# Altium footprint library USB Connectors.PcbLib: 41 footprints (part 1 of 3)
Each footprint in its own frame and in the unit in brackets; x right, y up, seen from the top. Pads: shape width x height; smd on the part's side, far side on the other; paste and mask are expansions set on the pad; w line width, h text height; cw(c..) or ccw(c..) is an arc to the next point about the centre after c.
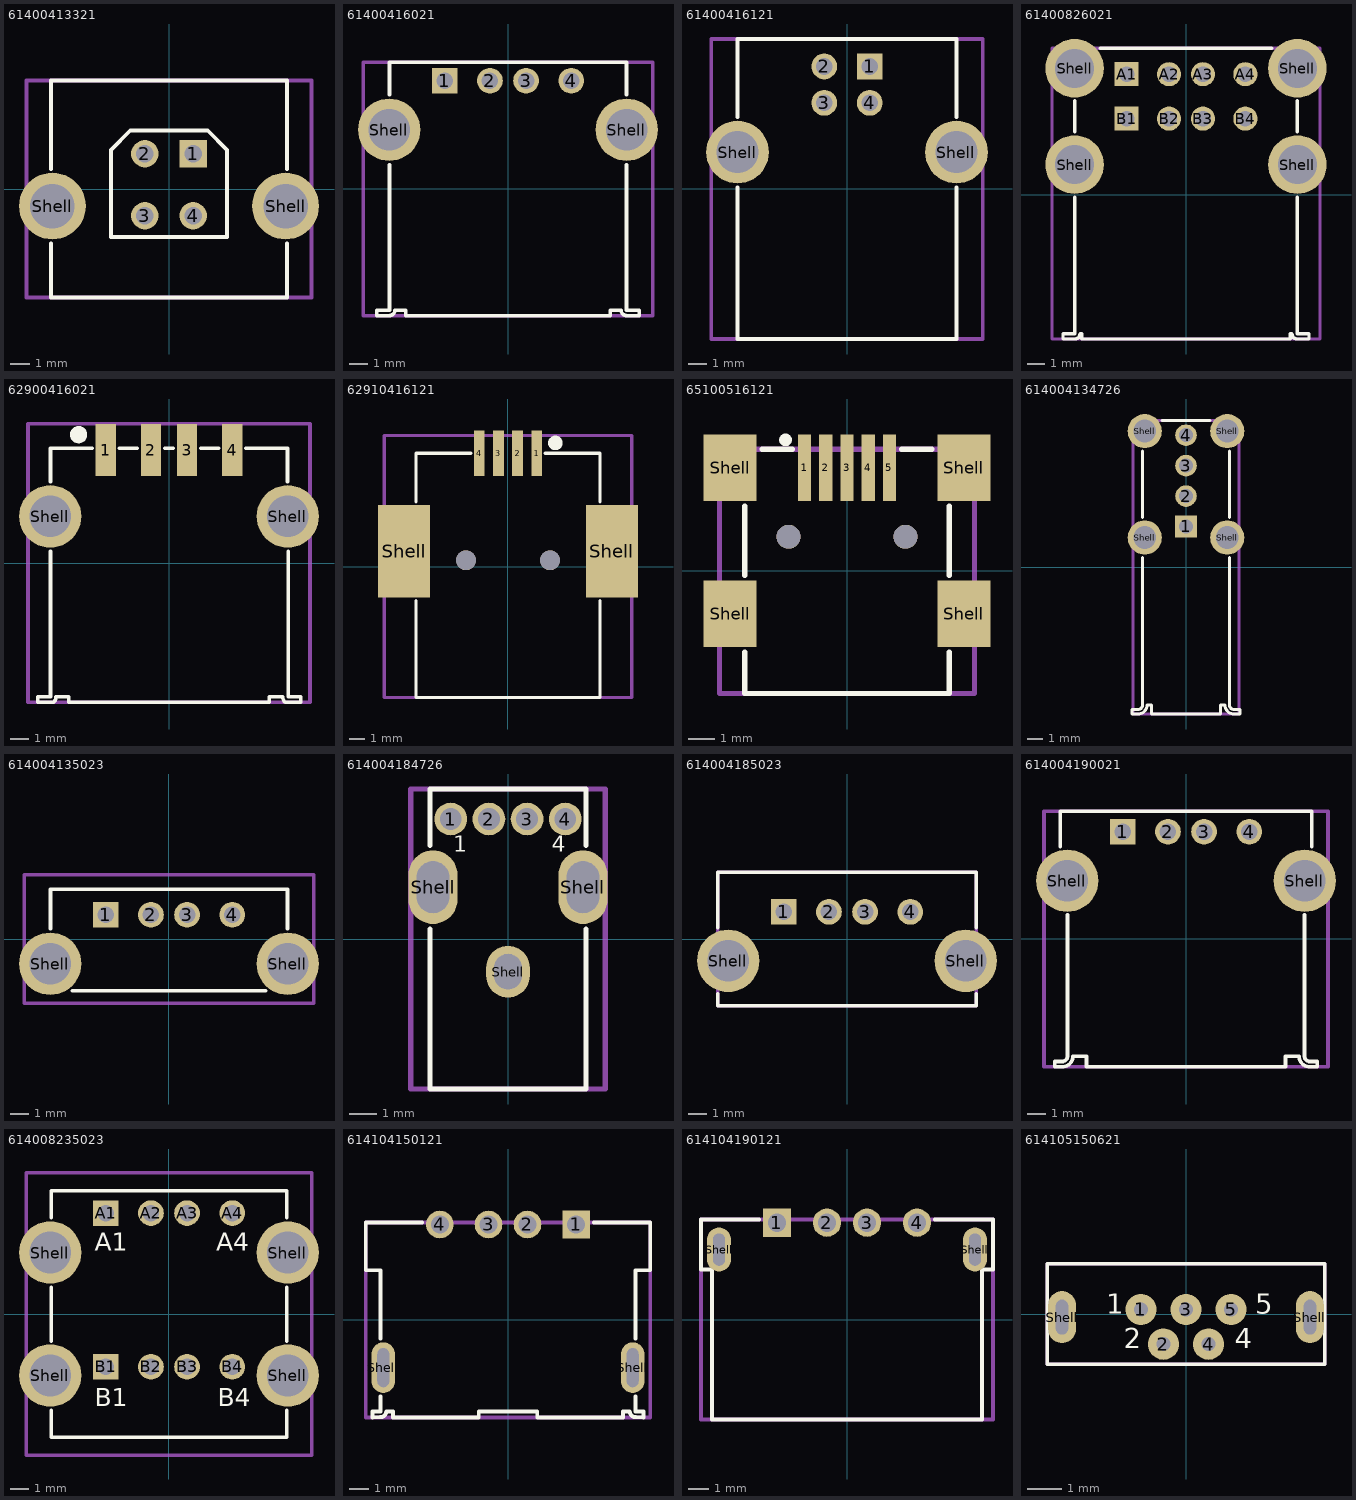
[diagram p0: the footprints below, top view; thin cyan lines are the x and y axes]

## 61400413321 [mm] "USB 2.0 Type B Vertical"
height 16.1
pads (6):
  rect 1.42x1.42 hole 0.92: 1(1.25,1.82)
  round 1.42 hole 0.92: 2(-1.25,1.82) 3(-1.25,-1.38) 4(1.25,-1.38)
  round 3.45 hole 2.3: Shell(-6.02,-0.88) Shell(6.02,-0.88)
Top Overlay:
  lines w0.2: -6.1,-2.8 -6.1,-5.6 6.1,-5.6 6.1,-2.8 ; -6.1,1.04 -6.1,5.6 6.1,5.6 6.1,1.04 ; -3,-2.48 3,-2.48 3,2.02 2,3.02 -2,3.02 -3,2.02 -3,-2.48
Mechanical 13:
  lines w0.2: -7.35,-5.6 -7.35,5.6 7.35,5.6 7.35,-5.6 -7.35,-5.6
3D body "61400413321.stp": height 16.15, standoff -4.17, extent -7.35,-5.6 7.35,5.6

## 61400416021 [mm] "USB 2.0 Type A Horizontal"
height 6.9
pads (6):
  rect 1.42x1.42 hole 0.92: 1(-3.5,5.99)
  round 1.42 hole 0.92: 2(-1,5.99) 3(1,5.99) 4(3.5,5.99)
  round 3.45 hole 2.3: Shell(-6.57,3.28) Shell(6.57,3.28)
Top Overlay:
  lines w0.2: -6.55,1.35 -6.55,-6.7 -7.25,-6.7 -7.25,-7 -6.56,-7 ccw(c-6.55,-6.7) -6.25,-6.7 -5.65,-6.7 -5.65,-7 5.65,-7 5.65,-6.7 6.25,-6.7 ccw(c6.55,-6.7) 6.56,-7 7.25,-7 7.25,-6.7 6.55,-6.7 6.55,1.35 ; -6.55,5.21 -6.55,7 6.55,7 6.55,5.21
Mechanical 13:
  lines w0.2: -8,-7 8,-7 8,7 -8,7 -8,-7
3D body "61400416021.stp": height 7.63, standoff -4.06, extent -7.999,-7 7.999,7

## 61400416121 [mm] "USB 2.0 Type B Horizontal"
height 11.05
pads (6):
  rect 1.42x1.42 hole 0.92: 1(1.25,6.74)
  round 1.42 hole 0.92: 2(-1.25,6.74) 3(-1.25,4.74) 4(1.25,4.74)
  round 3.45 hole 2.3: Shell(-6.02,2.03) Shell(6.02,2.03)
Top Overlay:
  lines w0.2: -6.02,0.1 -6.02,-8.25 6.02,-8.25 6.02,0.1 ; -6.02,3.96 -6.02,8.25 6.02,8.25 6.02,3.96
Mechanical 13:
  lines w0.2: -7.47,-8.25 7.47,-8.25 7.47,8.25 -7.47,8.25 -7.47,-8.25
3D body "61400416121.stp": height 11.1, standoff -3.76, extent -7.484,-8.25 7.484,8.25

## 61400826021 [mm] "USB 2.0 Type A Horizontal Dual Stacked"
height 15.34
pads (12):
  rect 1.42x1.42 hole 0.92: A1(-3.5,7.11) B1(-3.5,4.49)
  round 1.42 hole 0.92: A2(-1,7.11) A3(1,7.11) A4(3.5,7.11) B2(-1,4.49) B3(1,4.49) B4(3.5,4.49)
  round 3.45 hole 2.3: Shell(-6.57,1.78) Shell(-6.57,7.46) Shell(6.57,1.78) Shell(6.57,7.46)
Top Overlay:
  lines w0.2: -6.55,-0.14 -6.55,-8.2 -7.25,-8.2 -7.25,-8.5 -6.56,-8.5 ccw(c-6.55,-8.2) -6.25,-8.2 -6.15,-8.2 -6.15,-8.5 6.15,-8.5 6.15,-8.2 6.25,-8.2 ccw(c6.55,-8.2) 6.56,-8.5 7.25,-8.5 7.25,-8.2 6.55,-8.2 6.55,-0.14 ; -6.55,3.71 -6.55,5.54 ; -5.06,8.65 5.06,8.65 ; 6.55,3.71 6.55,5.54
Mechanical 13:
  lines w0.2: -7.9,-8.5 -7.9,8.65 7.9,8.65 7.9,-8.5 -7.9,-8.5
3D body "61400826021.stp": height 15.93, standoff -3.91, extent -7.912,-8.5 7.912,8.65

## 62900416021 [mm] "USB 2.0 SMT Type A Horizontal"
height 7.12
pads (6):
  rect 1.12x2.88 smd: 1(-3.5,6.25) 2(-1,6.25) 3(1,6.25) 4(3.5,6.25)
  round 3.45 hole 2.3: Shell(-6.57,2.58) Shell(6.57,2.58)
Top Overlay:
  circle w0.5: c-5,7.1 r0.224
  lines w0.2: -6.55,0.66 -6.55,-7.4 -7.25,-7.4 -7.25,-7.7 -6.39,-7.7 ; -6.55,4.5 -6.55,6.35 -4.26,6.35 ; -6.388,-7.702 ccw(c-6.65,-7.4) -6.25,-7.4 -5.55,-7.4 -5.55,-7.7 5.55,-7.7 5.55,-7.4 6.29,-7.4 ccw(c6.69,-7.4) 6.428,-7.702 ; -2.75,6.35 -1.76,6.35 ; -0.24,6.35 0.24,6.35 ; 1.75,6.35 2.74,6.35 ; 4.26,6.35 6.55,6.35 6.55,4.5 ; 6.43,-7.7 7.29,-7.7 7.29,-7.4 6.59,-7.4 6.59,0.66
Mechanical 13:
  lines w0.2: -7.8,-7.7 7.8,-7.7 7.8,7.7 -7.8,7.7 -7.8,-7.7
3D body "62900416021.stp": height 7.81, standoff -3.89, extent -7.81,-7.7 7.81,7.705

## 62910416121 [mm] "USB 2.0 Type B SMT Horizontal"
height 11.5
pads (8):
  rect 0.7x3 smd: 1(1.875,7.425) 2(0.625,7.425) 3(-0.625,7.425) 4(-1.875,7.425)
  rect 3.4x6.04 smd: Shell(-6.8,1.005) Shell(6.8,1.005)
  round 1.3 hole 1.3 unplated: ""(-2.75,0.425) ""(2.75,0.425)
Top Overlay:
  circle w0.5: c3.1,8.1 r0.224
  lines w0.2: -6.02,-2.215 -6.02,-8.575 6.02,-8.575 6.02,-2.215 ; -6.02,4.225 -6.02,7.425 -2.43,7.425 ; 2.43,7.425 6.02,7.425 6.02,4.225
Mechanical 13:
  lines w0.2: -8.1,-8.575 8.1,-8.575 8.1,8.575 -8.1,8.575 -8.1,-8.575
3D body "62910416121.stp": height 10.8, standoff -1.48, extent -8,-8.575 8,8.575

## 65100516121 [mm] "Mini USB 2.0 Type B SMT Horizontal 5 Contacts"
height 3.9
pads (11):
  rect 0.5x2.5 smd: 1(-1.6,3.875) 2(-0.8,3.875) 3(0,3.875) 4(0.8,3.875) 5(1.6,3.875)
  rect 2x2.5 smd: Shell(-4.4,-1.625) Shell(-4.4,3.875) Shell(4.4,-1.625) Shell(4.4,3.875)
  round 0.9 hole 0.9 unplated: ""(-2.2,1.275) ""(2.2,1.275)
Top Overlay:
  circle w0.25: c-2.314,4.925 r0.114
  lines w0.2: -3.85,-3.075 -3.85,-4.625 3.85,-4.625 3.85,-3.075 ; -3.85,-0.175 -3.85,2.425 ; -3.2,4.575 -2.05,4.575 ; 2.05,4.575 3.2,4.575 ; 3.85,-0.175 3.85,2.425
Mechanical 13:
  lines w0.2: -4.8,-4.625 4.8,-4.625 4.8,4.575 -4.8,4.575 -4.8,-4.625
3D body "65100516121.stp": height 3.92, standoff -0.98, extent -4.8,-4.625 4.8,4.625

## 614004134726 [mm] "USB 2.0 Type A Up Right"
height 14.5
pads (8):
  rect 1.42x1.42 hole 0.92: 1(0,2.68)
  round 1.42 hole 0.92: 2(0,4.68) 3(0,6.68) 4(0,8.68)
  round 2.25 hole 1.5: Shell(-2.71,1.95) Shell(-2.71,8.95) Shell(2.71,1.95) Shell(2.71,8.95)
Top Overlay:
  lines w0.2: -2.86,0.63 -2.86,-9.06 cw(c-3.15,-9.06) -3.15,-9.35 -3.55,-9.35 -3.55,-9.65 -3.15,-9.65 ccw(c-3.15,-9.06) -2.56,-9.06 -2.27,-9.06 -2.27,-9.65 2.27,-9.65 2.27,-9.06 2.56,-9.06 ccw(c3.15,-9.06) 3.15,-9.65 3.55,-9.65 3.55,-9.35 3.15,-9.35 cw(c3.15,-9.06) 2.86,-9.06 2.86,0.63 ; -2.86,3.27 -2.86,7.64 ; -1.59,9.65 1.59,9.65 ; 2.86,3.27 2.86,7.64
Mechanical 13:
  lines w0.2: -3.475,-9.65 -3.475,9.65 3.475,9.65 3.475,-9.65 -3.475,-9.65
3D body "614004134726.stp": height 14.51, standoff -3.8, extent -3.55,-9.65 3.55,9.65

## 614004135023 [mm] "USB 2.0 Type A Vertical"
height 15
pads (6):
  rect 1.42x1.42 hole 0.92: 1(-3.5,1.34)
  round 1.42 hole 0.92: 2(-1,1.34) 3(1,1.34) 4(3.5,1.34)
  round 3.45 hole 2.3: Shell(-6.57,-1.37) Shell(6.57,-1.37)
Top Overlay:
  lines w0.2: -6.55,0.56 -6.55,2.76 6.55,2.76 6.55,0.56 ; -5.35,-2.86 5.34,-2.86
Mechanical 13:
  lines w0.2: -8,-3.56 -8,3.56 8,3.56 8,-3.56 -8,-3.56
3D body "614004135023.stp": height 15.02, standoff -4.28, extent -7.999,-3.56 7.999,3.56

## 614004184726 [mm] "USB 2.0 Type A Up Right THT"
height 14.2
pads (7):
  round 1.2 hole 0.8: 1(-2.1,4.4) 2(-0.7,4.4) 3(0.7,4.4) 4(2.1,4.4)
  oval 1.8x2.7 hole 1.2 slot 1.9 at 90 deg: Shell(-2.75,1.9) Shell(2.75,1.9)
  oval 1.6x1.9 hole 1 slot 1.3 at 90 deg: Shell(0,-1.2)
Top Overlay:
  lines w0.2: -2.86,0.36 -2.86,-5.5 2.86,-5.5 2.86,0.36 ; -2.86,3.44 -2.86,5.5 2.86,5.5 2.86,3.44
  text "1" at -2,3 h1.02
  text "4" at 1.6,3.003 h1.02
Mechanical 13:
  lines w0.2: -3.56,-5.5 -3.56,5.5 3.56,5.5 3.56,-5.5 -3.56,-5.5
3D body "614004184726.stp": height 14.3, standoff -2.74, extent -3.56,-5.5 3.56,5.5

## 614004185023 [mm] "USB 2.0 Type A Vertical Short Type THT"
height 10
pads (6):
  rect 1.42x1.42 hole 0.92: 1(-3.5,1.5)
  round 1.42 hole 0.92: 2(-1,1.5) 3(1,1.5) 4(3.5,1.5)
  round 3.45 hole 2.3: Shell(-6.57,-1.21) Shell(6.57,-1.21)
Top Overlay:
  lines w0.2: -7.15,-3.04 -7.15,-3.7 7.15,-3.7 7.15,-3.04 ; -7.15,0.62 -7.15,3.7 7.15,3.7 7.15,0.62
Mechanical 13:
  lines w0.2: -7.15,-3.7 -7.15,3.7 7.15,3.7 7.15,-3.7 -7.15,-3.7
3D body "614004185023.stp": height 10.05, standoff -2.95, extent -7.15,-3.7 7.15,3.7

## 614004190021 [mm] "USB 2.0 Type A Horizontal THT"
height 6.9
pads (6):
  rect 1.42x1.42 hole 0.92: 1(-3.5,5.935)
  round 1.42 hole 0.92: 2(-1,5.935) 3(1,5.935) 4(3.5,5.935)
  round 3.45 hole 2.3: Shell(-6.57,3.225) Shell(6.57,3.225)
Top Overlay:
  lines w0.2: -6.95,5.115 -6.95,7.075 6.95,7.075 6.95,5.115 ; -6.55,1.335 -6.55,-6.475 cw(c-6.85,-6.475) -6.85,-6.775 -7.25,-6.775 -7.25,-7.075 -6.85,-7.075 ccw(c-6.85,-6.475) -6.25,-6.475 -5.5,-6.475 -5.5,-7.075 5.5,-7.075 5.5,-6.475 6.25,-6.475 ccw(c6.85,-6.475) 6.85,-7.075 7.25,-7.075 7.25,-6.775 6.85,-6.775 cw(c6.85,-6.475) 6.55,-6.475 6.55,1.335
Mechanical 13:
  lines w0.2: -7.85,-7.075 -7.85,7.075 7.85,7.075 7.85,-7.075 -7.85,-7.075
3D body "614004190021.stp": height 7.7, standoff -3.7, extent -7.85,-7.075 7.85,7.075

## 614008235023 [mm] "USB 2.0 Type A Vertical Dual"
height 16.7
pads (12):
  rect 1.42x1.42 hole 0.92: A1(-3.5,5.58) B1(-3.5,-2.92)
  round 1.42 hole 0.92: A2(-1,5.58) A3(1,5.58) A4(3.5,5.58) B2(-1,-2.92) B3(1,-2.92) B4(3.5,-2.92)
  round 3.45 hole 2.3: Shell(-6.57,-3.4) Shell(-6.57,3.4) Shell(6.57,-3.4) Shell(6.57,3.4)
Top Overlay:
  lines w0.2: -6.52,-5.33 -6.52,-6.82 6.52,-6.82 6.52,-5.33 ; -6.52,-1.5 -6.52,1.47 ; -6.52,5.33 -6.52,6.82 6.52,6.82 6.52,5.33 ; 6.52,-1.5 6.52,1.47
  text "B4" at 2.7,-5.1 h1.02
  text "B1" at -4.1,-5.1 h1.02
  text "A4" at 2.6,3.5 h1.02
  text "A1" at -4.1,3.5 h1.02
Mechanical 13:
  lines w0.2: -7.89,-7.82 -7.89,7.82 7.89,7.82 7.89,-7.82 -7.89,-7.82
3D body "614008235023.stp": height 17.7, standoff -3.35, extent -7.889,-7.82 7.889,7.82

## 614104150121 [mm] "USB 2.0 THT Type A Horizontal Slim Type"
height 6.82
pads (6):
  rect 1.42x1.42 hole 0.92: 1(3.5,4.9)
  round 1.42 hole 0.92: 2(1,4.9) 3(-1,4.9) 4(-3.5,4.9)
  oval 1.2x2.6 hole 0.6 slot 2 at 90 deg: Shell(-6.4,-2.45) Shell(6.4,-2.45)
Top Overlay:
  lines w0.2: -6.55,-3.93 -6.55,-4.69 -6.95,-4.69 -6.95,-5 -6.56,-4.99 ccw(c-6.55,-4.69) -6.25,-4.69 -5.9,-4.69 -5.9,-5 -1.5,-5 -1.5,-4.7 1.5,-4.7 1.5,-5 5.9,-5 5.9,-4.69 6.25,-4.69 ccw(c6.55,-4.69) 6.56,-4.99 6.95,-5 6.95,-4.69 6.55,-4.69 6.55,-3.93 ; -6.55,-0.96 -6.55,2.55 -7.3,2.55 -7.3,5 -4.4,5 ; 4.41,5 7.3,5 7.3,2.55 6.55,2.55 6.55,-0.96
Mechanical 13:
  lines w0.2: -7.3,-5 -7.3,5 7.3,5 7.3,-5 -7.3,-5
3D body "614104150121.stp": height 7.26, standoff -1.56, extent -7.3,-5 7.3,5

## 614104190121 [mm] "USB 2.0 Type A Horizontal THT Short Type"
height 5.72
pads (6):
  rect 1.42x1.42 hole 0.92: 1(-3.5,4.85)
  round 1.42 hole 0.92: 2(-1,4.85) 3(1,4.85) 4(3.5,4.85)
  oval 1.2x2.2 hole 0.6 slot 1.6 at 90 deg: Shell(-6.4,3.5) Shell(6.4,3.5)
Top Overlay:
  lines w0.2: -4.41,5 -7.3,5 -7.3,2.5 -6.75,2.5 -6.75,-5 6.75,-5 6.75,2.5 7.3,2.5 7.3,5 4.4,5
Mechanical 13:
  lines w0.2: -7.3,-5 -7.3,5 7.3,5 7.3,-5 -7.3,-5
3D body "614104190121.stp": height 5.94, standoff -1.77, extent -7.3,-5 7.3,5

## 614105150621 [mm] "Micro USB 2.0 Type AB Vertical 5 Contacts"
height 5.61
pads (7):
  round 0.9 hole 0.4: 1(-1.3,0.13) 2(-0.65,-0.87) 3(0,0.13) 4(0.65,-0.87) 5(1.3,0.13)
  oval 0.8x1.5 hole 0.35 slot 1 at 90 deg: Shell(-3.575,-0.09) Shell(3.575,-0.09)
Top Overlay:
  lines w0.1: -4,-1.45 4,-1.45 4,1.45 -4,1.45 -4,-1.45
  text "4" at 1.4,-1.19 h1
  text "5" at 2,-0.19 h1
  text "2" at -1.8,-1.19 h1
  text "1" at -2.3,-0.19 h1
Mechanical 13:
  lines w0.1: -4,-1.45 4,-1.45 4,1.45 -4,1.45 -4,-1.45
3D body "614105150621.stp": height 5.66, standoff -1.45, extent -4,-1.45 4,1.45